# Altium footprint library HubProModel_v1.PcbLib: 67 footprints (part 3 of 5)
Each footprint in its own frame and in the unit in brackets; x right, y up, seen from the top. Pads: shape width x height; smd on the part's side, far side on the other; paste and mask are expansions set on the pad; w line width, h text height; cw(c..) or ccw(c..) is an arc to the next point about the centre after c.
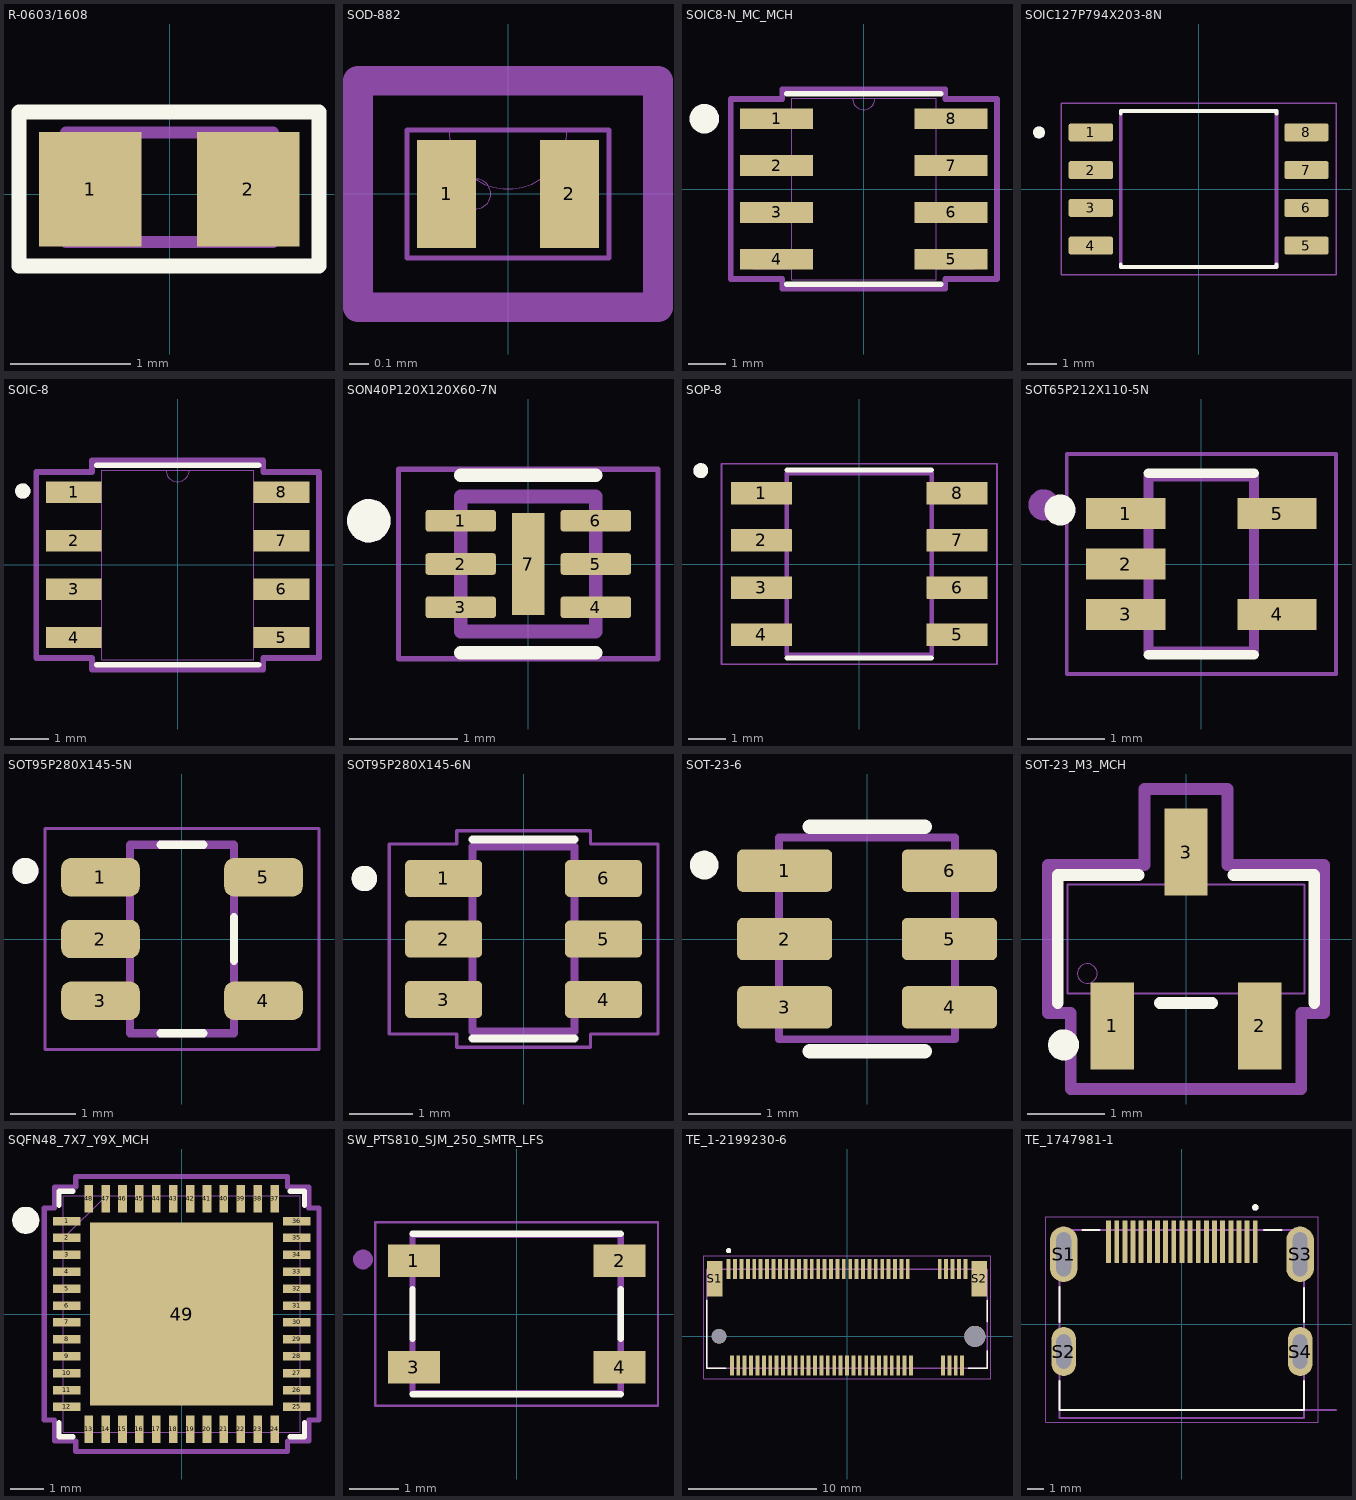
[diagram p2: the footprints below, top view; thin cyan lines are the x and y axes]

## R-0603/1608 [mm] "Chip Resistor, 2-Leads, Body 1.60x0.80mm, IPC Medium Density"
height 0.45
pads (2):
  rect 0.85x0.95 smd: 1(-0.659,0.042) 2(0.651,0.042)
Top Overlay:
  lines w0.127: -1.249,-0.594 -1.249,0.682 1.239,0.682 1.239,-0.594 -1.249,-0.594
Top Assembly:
  lines w0.1: -0.86,-0.394 0.858,-0.394 0.858,0.512 -0.801,0.512 -0.86,0.512 -0.86,-0.394
  text "'.Designator'" at -3.112,-1.801 h1.27
3D body "0603 resistor.STEP": height 0.45, standoff 0, extent -0.799,-0.348 0.801,0.452

## SOD-882 [mil] "Single-line low capacitance Transil™, transient surge voltage suppressor (TVS) for ESD protection"
pads (2):
  rect 12x22 smd paste+0 mask+0: 1(-12.5,0) 2(12.5,0)
Mechanical 13:
  circle w0: c-6.5,0 r3
  lines w0: -12,13 ccw(c0,13) 12,13
  lines w1: -20.5,-13 -20.5,13 20.5,13 20.5,-13 -20.5,-13
Mechanical 15:
  lines w6: -30.5,-23 30.5,-23 30.5,-21 30.5,21 30.5,23 -30.5,23 -30.5,21 -30.5,-21 -30.5,-23
3D body "SOD882_STM.step": height 20.12, standoff 0, extent -20.51,-12.99 20.51,12.99

## SOIC8-N_MC_MCH [mil] "Microwire Serial EEPROM Family, 1.8 to 5.5V, 3 MHz, -40°Cto 125°C, SOIC-8, RoHS"
pads (8):
  rect 78x22 smd paste+0 mask+0: 1(-93,75) 2(-93,25) 3(-93,-25) 4(-93,-75) 5(93,-75) 6(93,-25) 7(93,25) 8(93,75)
Top Overlay:
  lines w6: -82,-101.5 82,-101.5 ; -82,101.5 82,101.5
  lines w15.75: -170.05,82.87 ccw(c-170,75) -169.95,82.87
Mechanical 13:
  lines w0: -12,96.5 ccw(c0,96.5) 12,96.5
  lines w1: -118,-85 -77,-85 -77,-65 -118,-65 -118,-85 ; -118,-35 -77,-35 -77,-15 -118,-15 -118,-35 ; -118,15 -77,15 -77,35 -118,35 -118,15 ; -118,65 -77,65 -77,85 -118,85 -118,65 ; -77,-96.5 -77,96.5 77,96.5 77,-96.5 -77,-96.5 ; 77,-85 118,-85 118,-65 77,-65 77,-85 ; 77,-35 118,-35 118,-15 77,-15 77,-35 ; 77,15 118,15 118,35 77,35 77,15 ; 77,65 118,65 118,85 77,85 77,65
Mechanical 15:
  lines w6: -142,-96 -87,-96 -87,-106.5 87,-106.5 87,-96 142,-96 142,96 87,96 87,106.5 -87,106.5 -87,96 -142,96 -142,-96
3D body "SOIC8-N_MC_MCH.step": height 69.09, standoff 0, extent -117.99,-96.5 117.99,96.5

## SOIC127P794X203-8N [mm] "IC FLASH 16MBIT SPI/QUAD 8SOIJ"
height 0.89
pads (8):
  rrect25% 1.49x0.61 smd: 1(-3.63,1.905) 2(-3.63,0.635) 3(-3.63,-0.635) 4(-3.63,-1.905) 5(3.63,-1.905) 6(3.63,-0.635) 7(3.63,0.635) 8(3.63,1.905)
Top Overlay:
  circle w0.2: c-5.375,1.905 r0.1
  lines w0.127: -2.625,-2.53 -2.625,-2.63 2.625,-2.63 2.625,-2.53 ; -2.625,2.53 -2.625,2.63 2.625,2.63 2.625,2.53
Mechanical 13:
  circle w0.2: c-5.375,1.905 r0.1
  lines w0.127: -2.625,-2.63 2.625,-2.63 2.625,2.63 -2.625,2.63 -2.625,-2.63
Mechanical 15:
  lines w0.05: -4.625,-2.88 -4.625,2.88 4.625,2.88 4.625,-2.88 -4.625,-2.88
3D body "step_temp.STEP": height 2.03, standoff 0, extent -3.97,-2.63 3.97,2.63

## SOIC-8 [mil] "FLASH - NOR Memory IC 8Mb (1M x 8) SPI - Quad I/O 104 MHz 8-SOIC"
pads (8):
  rect 57.5x22 smd paste+0 mask+0: 1(-107.25,75) 2(-107.25,25) 3(-107.25,-25) 4(-107.25,-75) 5(107.25,-75) 6(107.25,-25) 7(107.25,25) 8(107.25,75)
Top Overlay:
  circle w7.87: c-159.88,76.34 r3.94
  lines w6: -83.5,-103 83.5,-103 ; -83.5,103 83.5,103
Mechanical 13:
  circle w7.87: c-159.88,76.34 r3.94
  lines w0: -12,98 ccw(c0,98) 12,98
  lines w1: -122,-85 -78.5,-85 -78.5,-65 -122,-65 -122,-85 ; -122,-35 -78.5,-35 -78.5,-15 -122,-15 -122,-35 ; -122,15 -78.5,15 -78.5,35 -122,35 -122,15 ; -122,65 -78.5,65 -78.5,85 -122,85 -122,65 ; -78.5,-98 -78.5,98 78.5,98 78.5,-98 -78.5,-98 ; 78.5,-85 122,-85 122,-65 78.5,-65 78.5,-85 ; 78.5,-35 122,-35 122,-15 78.5,-15 78.5,-35 ; 78.5,15 122,15 122,35 78.5,35 78.5,15 ; 78.5,65 122,65 122,85 78.5,85 78.5,65
Mechanical 15:
  lines w6: -146,-96 -88.5,-96 -88.5,-108 88.5,-108 88.5,-96 146,-96 146,96 88.5,96 88.5,108 -88.5,108 -88.5,96 -146,96 -146,-96
3D body "WIN_SN-8_WIN.step": height 69.09, standoff 0, extent -122.01,-97.99 122.01,97.99

## SON40P120X120X60-7N [mm] "IC REG LINEAR 3.3V 500MA 6TDFN"
pads (7):
  rrect25% 0.65x0.2 smd: 1(-0.625,0.4) 2(-0.625,0) 3(-0.625,-0.4) 4(0.625,-0.4) 5(0.625,0) 6(0.625,0.4)
  rect 0.3x0.94 smd paste-1: 7(0,0)
Top Overlay:
  circle w0.2: c-1.475,0.4 r0.1
  lines w0.127: -0.625,-0.82 0.625,-0.82 ; -0.625,0.82 0.625,0.82
Top Paste:
  region: 0.072,-0.392 -0.072,-0.392 -0.072,0.392 0.072,0.392
Mechanical 13:
  circle w0.2: c-1.475,0.4 r0.1
  lines w0.127: -0.625,-0.625 -0.625,0.625 0.625,0.625 0.625,-0.625 -0.625,-0.625
Mechanical 15:
  lines w0.05: -1.2,-0.875 -1.2,0.875 1.2,0.875 1.2,-0.875 -1.2,-0.875

## SOP-8 [mm] "FLASH - NOR Memory IC 8Mb (1M x 8) SPI 86 MHz 8-SOP"
height 1.75
pads (8):
  rrect8% 1.65x0.61 smd: 1(-2.635,1.905) 2(-2.635,0.635) 3(-2.635,-0.635) 4(-2.635,-1.905) 5(2.635,-1.905) 6(2.635,-0.635) 7(2.635,0.635) 8(2.635,1.905)
Top Overlay:
  circle w0.2: c-4.27,2.515 r0.1
  lines w0.127: -1.95,-2.53 1.95,-2.53 ; -1.95,2.53 1.95,2.53
Mechanical 13:
  circle w0.2: c-4.27,2.515 r0.1
  lines w0.127: -1.95,-2.45 -1.95,2.45 1.95,2.45 1.95,-2.45 -1.95,-2.45
Mechanical 15:
  lines w0.05: -3.71,-2.7 -3.71,2.7 3.71,2.7 3.71,-2.7 -3.71,-2.7
3D body "step_temp.STEP": height 1.75, standoff 0, extent -3,-2.45 3,2.45

## SOT65P212X110-5N [mm] "Inverter Schmitt Trigger 1-Element CMOS 5-Pin TSSOP T/R"
pads (5):
  rect 1.02x0.4 smd: 1(-0.975,0.65) 2(-0.975,0) 3(-0.975,-0.65) 4(0.975,-0.65) 5(0.975,0.65)
Top Overlay:
  circle w0.2: c-1.822,0.696 r0.1
  lines w0.127: -0.68,-1.17 0.68,-1.17 ; -0.68,1.17 0.68,1.17
Mechanical 13:
  circle w0.2: c-2.032,0.762 r0.1
  lines w0.127: -0.68,-1.13 -0.68,1.13 0.68,1.13 0.68,-1.13 -0.68,-1.13
Mechanical 15:
  lines w0.05: -1.735,-1.42 1.735,-1.42 1.735,1.42 -1.735,1.42 -1.735,-1.42
3D body "step_temp.STEP": height 1.1, standoff 0, extent -1.062,-1 1.062,1

## SOT95P280X145-5N [mm] "1.5A Buck Converter in SOT23 Package"
pads (5):
  rrect50% 1.21x0.59 smd: 1(-1.255,0.95) 2(-1.255,0) 3(-1.255,-0.95) 4(1.255,-0.95) 5(1.255,0.95)
Top Overlay:
  circle w0.2: c-2.41,1.05 r0.1
  lines w0.127: -0.33,-1.45 0.33,-1.45 ; -0.33,1.45 0.33,1.45 ; 0.8,-0.335 0.8,0.335
Mechanical 13:
  circle w0.2: c-2.41,1.05 r0.1
  lines w0.127: -0.8,-1.45 0.8,-1.45 0.8,1.45 -0.8,1.45 -0.8,-1.45
Mechanical 15:
  lines w0.05: -2.11,-1.7 -2.11,1.7 2.11,1.7 2.11,-1.7 -2.11,-1.7

## SOT95P280X145-6N [mm] "USB dedicated charging port controller - Gen 2"
pads (6):
  rrect25% 1.21x0.58 smd: 1(-1.255,0.95) 2(-1.255,0) 3(-1.255,-0.95) 4(1.255,-0.95) 5(1.255,0) 6(1.255,0.95)
Top Overlay:
  circle w0.2: c-2.5,0.95 r0.1
  lines w0.127: -0.8,-1.56 0.8,-1.56 ; -0.8,1.56 0.8,1.56
Mechanical 13:
  circle w0.2: c-2.5,0.95 r0.1
  lines w0.127: -0.8,-1.45 0.8,-1.45 0.8,1.45 -0.8,1.45 -0.8,-1.45
Mechanical 15:
  lines w0.05: -2.11,-1.49 -1.05,-1.49 -1.05,-1.7 1.05,-1.7 1.05,-1.49 2.11,-1.49 2.11,1.49 1.05,1.49 1.05,1.7 -1.05,1.7 -1.05,1.49 -2.11,1.49 -2.11,-1.49
3D body "step_temp.STEP": height 1.45, standoff 0, extent -1.4,-1.45 1.4,1.45

## SOT-23-6 [mm] "LOAD SWITCH,SOT26,T&R,3K"
pads (6):
  rrect25% 1.32x0.59 smd: 1(-1.145,0.95) 2(-1.145,0) 3(-1.145,-0.95) 4(1.145,-0.95) 5(1.145,0) 6(1.145,0.95)
Top Overlay:
  circle w0.2: c-2.264,1.027 r0.1
  lines w0.2: -0.8,-1.56 0.8,-1.56 ; -0.8,1.56 0.8,1.56
Top Assembly:
  circle w0.2: c-0.793,0.967 r0.1
  lines w0.11: -1.222,-1.393 1.221,-1.393 1.221,1.413 -1.207,1.413 -1.222,1.413 -1.222,-1.393
  text "'.Designator'" at -3.613,-2.754 h1.27
3D body "User Library-SOT23-6-1.STEP": height 1.09, standoff 0, extent -1.211,-1.389 1.215,1.405

## SOT-23_M3_MCH [mil] "Supervisor Open Drain or Open Collector 1 Channel SOT-23-3"
height 35.04
pads (3):
  rect 22x44 smd paste+0 mask+0: 1(-37.4,-44) 2(37.4,-44) 3(0,44)
Top Overlay:
  circle w7.87: c-62.02,-53.68 r3.94
  lines w6: -65,-32.5 -65,32.5 -24.1,32.5 ; -13.3,-32.5 13.3,-32.5 ; 24.1,32.5 65,32.5 65,-32.5
Mechanical 13:
  circle w0: c-50,-17.5 r5
  lines w1: -60,-27.5 60,-27.5 60,27.5 -60,27.5 -60,-27.5 ; -47.4,-52 -47.4,-27.5 -27.4,-27.5 -27.4,-52 -47.4,-52 ; -10,27.5 10,27.5 10,52 -10,52 -10,27.5 ; 27.4,-52 27.4,-27.5 47.4,-27.5 47.4,-52 27.4,-52
Mechanical 15:
  lines w6: -70,-37.5 -70,37.5 -21,37.5 -21,76 21,76 21,37.5 70,37.5 70,-37.5 58.4,-37.5 58.4,-76 -58.4,-76 -58.4,-37.5 -70,-37.5
3D body "SOT-23_M3_MCH.step": height 44.09, standoff 0, extent -60,-52.01 60,52.01

## SQFN48_7X7_Y9X_MCH [mil] "Ethernet Controller 10/100/1000 Base-TX PHY - Interface 48-SQFN (7x7)"
pads (49):
  rect 32x10 smd paste+0 mask+0: 1(-134,108.27) 2(-134,88.58) 3(-134,68.9) 4(-134,49.21) 5(-134,29.53) 6(-134,9.84) 7(-134,-9.84) 8(-134,-29.53) 9(-134,-49.21) 10(-134,-68.9) 11(-134,-88.58) 12(-134,-108.27) 25(134,-108.27) 26(134,-88.58) 27(134,-68.9) 28(134,-49.21) 29(134,-29.53) 30(134,-9.84) 31(134,9.84) 32(134,29.53) 33(134,49.21) 34(134,68.9) 35(134,88.58) 36(134,108.27)
  rect 10x32 smd paste+0 mask+0: 13(-108.27,-134) 14(-88.58,-134) 15(-68.9,-134) 16(-49.21,-134) 17(-29.53,-134) 18(-9.84,-134) 19(9.84,-134) 20(29.53,-134) 21(49.21,-134) 22(68.9,-134) 23(88.58,-134) 24(108.27,-134) 37(108.27,134) 38(88.58,134) 39(68.9,134) 40(49.21,134) 41(29.53,134) 42(9.84,134) 43(-9.84,134) 44(-29.53,134) 45(-49.21,134) 46(-68.9,134) 47(-88.58,134) 48(-108.27,134)
  rect 213x213 smd paste-106.5 mask+0: 49(0,0)
Top Overlay:
  lines w6: -143,-126.37 -143,-143 -126.37,-143 ; -143,126.37 -143,143 -126.37,143 ; 126.37,-143 143,-143 143,-126.37 ; 126.37,143 143,143 143,126.37
  lines w15.75: -181.61,117 ccw(c-181.56,109.13) -181.51,117
Top Paste:
  region: -57.19,102.56 -102.56,102.56 -102.56,57.19 -57.19,57.19
  region: -57.19,49.31 -102.56,49.31 -102.56,3.94 -57.19,3.94
  region: -57.19,-3.94 -102.56,-3.94 -102.56,-49.31 -57.19,-49.31
  region: -57.19,-57.19 -102.56,-57.19 -102.56,-102.56 -57.19,-102.56
  region: -3.94,102.56 -49.31,102.56 -49.31,57.19 -3.94,57.19
  region: -3.94,49.31 -49.31,49.31 -49.31,3.94 -3.94,3.94
  region: -3.94,-3.94 -49.31,-3.94 -49.31,-49.31 -3.94,-49.31
  region: -3.94,-57.19 -49.31,-57.19 -49.31,-102.56 -3.94,-102.56
  region: 49.31,102.56 3.94,102.56 3.94,57.19 49.31,57.19
  region: 49.31,49.31 3.94,49.31 3.94,3.94 49.31,3.94
  region: 49.31,-3.94 3.94,-3.94 3.94,-49.31 49.31,-49.31
  region: 49.31,-57.19 3.94,-57.19 3.94,-102.56 49.31,-102.56
  region: 102.56,102.56 57.19,102.56 57.19,57.19 102.56,57.19
  region: 102.56,49.31 57.19,49.31 57.19,3.94 102.56,3.94
  region: 102.56,-3.94 57.19,-3.94 57.19,-49.31 102.56,-49.31
  region: 102.56,-57.19 57.19,-57.19 57.19,-102.56 102.56,-102.56
Mechanical 13:
  lines w1: -138,88 -88,138 ; -138,-138 138,-138 138,138 -138,138 -138,-138 ; -138,-114.27 -138,-102.27 -138,-114.27 ; -138,-94.58 -138,-82.58 -138,-94.58 ; -138,-74.9 -138,-62.9 -138,-74.9 ; -138,-55.21 -138,-43.21 -138,-55.21 ; -138,-35.53 -138,-23.53 -138,-35.53 ; -138,-15.84 -138,-3.84 -138,-15.84 ; -138,3.84 -138,15.84 -138,3.84 ; -138,23.53 -138,35.53 -138,23.53 ; -138,43.21 -138,55.21 -138,43.21 ; -138,62.9 -138,74.9 -138,62.9 ; -138,82.58 -138,94.58 -138,82.58 ; -138,102.27 -138,114.27 -138,102.27 ; -114.27,-138 -102.27,-138 -114.27,-138 ; -114.27,138 -102.27,138 -114.27,138 ; -94.58,-138 -82.58,-138 -94.58,-138 ; -94.58,138 -82.58,138 -94.58,138 ; -74.9,-138 -62.9,-138 -74.9,-138 ; -74.9,138 -62.9,138 -74.9,138 ; -55.21,-138 -43.21,-138 -55.21,-138 ; -55.21,138 -43.21,138 -55.21,138 ; -35.53,-138 -23.53,-138 -35.53,-138 ; -35.53,138 -23.53,138 -35.53,138 ; -15.84,-138 -3.84,-138 -15.84,-138 ; -15.84,138 -3.84,138 -15.84,138 ; 3.84,-138 15.84,-138 3.84,-138 ; 3.84,138 15.84,138 3.84,138 ; 23.53,-138 35.53,-138 23.53,-138 ; 23.53,138 35.53,138 23.53,138 ; 43.21,-138 55.21,-138 43.21,-138 ; 43.21,138 55.21,138 43.21,138 ; 62.9,-138 74.9,-138 62.9,-138 ; 62.9,138 74.9,138 62.9,138 ; 82.58,-138 94.58,-138 82.58,-138 ; 82.58,138 94.58,138 82.58,138 ; 102.27,-138 114.27,-138 102.27,-138 ; 102.27,138 114.27,138 102.27,138 ; 138,-114.27 138,-102.27 138,-114.27 ; 138,-94.58 138,-82.58 138,-94.58 ; 138,-74.9 138,-62.9 138,-74.9 ; 138,-55.21 138,-43.21 138,-55.21 ; 138,-35.53 138,-23.53 138,-35.53 ; 138,-15.84 138,-3.84 138,-15.84 ; 138,3.84 138,15.84 138,3.84 ; 138,23.53 138,35.53 138,23.53 ; 138,43.21 138,55.21 138,43.21 ; 138,62.9 138,74.9 138,62.9 ; 138,82.58 138,94.58 138,82.58 ; 138,102.27 138,114.27 138,102.27
Mechanical 15:
  lines w6: -160,-123.27 -148,-123.27 -148,-148 -123.27,-148 -123.27,-160 123.27,-160 123.27,-148 148,-148 148,-123.27 160,-123.27 160,123.27 148,123.27 148,148 123.27,148 123.27,160 -123.27,160 -123.27,148 -148,148 -148,123.27 -160,123.27 -160,-123.27
3D body "SQFN48_7X7_Y9X_MCH.step": height 39.09, standoff 0, extent -137.99,-137.99 137.99,137.99

## SW_PTS810_SJM_250_SMTR_LFS [mm] "Tactile Switch SPST-NO Top Actuated Surface Mount"
height 0.89
pads (4):
  rect 1.05x0.65 smd: 1(-2.075,1.075) 2(2.075,1.075) 3(-2.075,-1.075) 4(2.075,-1.075)
Top Overlay:
  lines w0.127: -2.1,-1.62 2.1,-1.62 ; -2.1,-0.5 -2.1,0.5 ; -2.1,1.62 2.1,1.62 ; 2.1,-0.5 2.1,0.5
Mechanical 13:
  circle w0.2: c-3.1,1.1 r0.1
  lines w0.127: -2.1,-1.6 -2.1,1.6 2.1,1.6 2.1,-1.6 -2.1,-1.6
Mechanical 15:
  lines w0.05: -2.85,-1.85 -2.85,1.85 2.85,1.85 2.85,-1.85 -2.85,-1.85

## TE_1-2199230-6 [mm] "M.2 0.5PITCH 4.2H KEY M 30U AU"
pads (71):
  rect 0.3x1.55 smd: 1(-9.25,5.275) 2(-9,-2.275) 3(-8.75,5.275) 4(-8.5,-2.275) 5(-8.25,5.275) 6(-8,-2.275) 7(-7.75,5.275) 8(-7.5,-2.275) 9(-7.25,5.275) 10(-7,-2.275) 11(-6.75,5.275) 12(-6.5,-2.275) 13(-6.25,5.275) 14(-6,-2.275) 15(-5.75,5.275) 16(-5.5,-2.275) 17(-5.25,5.275) 18(-5,-2.275) 19(-4.75,5.275) 20(-4.5,-2.275) 21(-4.25,5.275) 22(-4,-2.275) 23(-3.75,5.275) 24(-3.5,-2.275) 25(-3.25,5.275) 26(-3,-2.275) 27(-2.75,5.275) 28(-2.5,-2.275) 29(-2.25,5.275) 30(-2,-2.275) 31(-1.75,5.275) 32(-1.5,-2.275) 33(-1.25,5.275) 34(-1,-2.275) 35(-0.75,5.275) 36(-0.5,-2.275) 37(-0.25,5.275) 38(0,-2.275) 39(0.25,5.275) 40(0.5,-2.275) 41(0.75,5.275) 42(1,-2.275) 43(1.25,5.275) 44(1.5,-2.275) 45(1.75,5.275) 46(2,-2.275) 47(2.25,5.275) 48(2.5,-2.275) 49(2.75,5.275) 50(3,-2.275) 51(3.25,5.275) 52(3.5,-2.275) 53(3.75,5.275) 54(4,-2.275) 55(4.25,5.275) 56(4.5,-2.275) 57(4.75,5.275) 58(5,-2.275) 67(7.25,5.275) 68(7.5,-2.275) 69(7.75,5.275) 70(8,-2.275) 71(8.25,5.275) 72(8.5,-2.275) 73(8.75,5.275) 74(9,-2.275) 75(9.25,5.275)
  rect 1.2x2.75 smd: S1(-10.35,4.5) S2(10.35,4.5)
  round 1.15 hole 1.15 unplated: ""(-10,0)
  round 1.65 hole 1.65 unplated: ""(10,0)
Top Overlay:
  circle w0.2: c-9.25,6.7 r0.1
  lines w0.127: -10.95,2.805 -10.95,-2.5 -9.47,-2.5 ; 9.47,-2.5 10.95,-2.5 10.95,-1.145 ; 10.95,1.145 10.95,2.805
Mechanical 13:
  circle w0.2: c-9.25,6.7 r0.1
  lines w0.127: -10.95,-2.5 10.95,-2.5 10.95,5.25 -10.95,5.25 -10.95,-2.5
Mechanical 15:
  lines w0.05: -11.2,-3.3 -11.2,6.3 11.25,6.3 11.25,-3.3 -11.2,-3.3
3D body "step_temp.STEP": height 4.2, standoff -0.65, extent -11.049,-3.334 10.851,5.366

## TE_1747981-1 [mm] "HDMI Type A Standard Top Mount Receptable"
height 6.58
pads (23):
  rect 0.3x2.6 smd mask+0.05: 1(4.5,5.035) 2(4,5.035) 3(3.5,5.035) 4(3,5.035) 5(2.5,5.035) 6(2,5.035) 7(1.5,5.035) 8(1,5.035) 9(0.5,5.035) 10(0,5.035) 11(-0.5,5.035) 12(-1,5.035) 13(-1.5,5.035) 14(-2,5.035) 15(-2.5,5.035) 16(-3,5.035) 17(-3.5,5.035) 18(-4,5.035) 19(-4.5,5.035)
  oval 1.7x3.4 hole 0.9 slot 2.7 at 90 deg: S1(-7.25,4.275) S3(7.25,4.275)
  oval 1.5x3 hole 0.9 slot 2.1 at 90 deg: S2(-7.25,-1.685) S4(7.25,-1.685)
Top Overlay:
  circle w0.2: c4.5,7.155 r0.1
  lines w0.127: -7.5,-3.495 -7.5,-5.275 7.5,-5.275 7.5,-3.495 ; -7.5,0.125 -7.5,2.265 ; -6.11,5.775 -5.05,5.775 ; 5.05,5.775 6.11,5.775 ; 7.5,0.125 7.5,2.215
Mechanical 13:
  circle w0.2: c4.5,7.155 r0.1
  lines w0.127: 9.45,-5.27 7.5,-5.27 ; -7.5,-5.275 -7.5,5.775 7.5,5.775 7.5,-5.27 ; -7.5,-5.275 -7.5,-5.775 7.5,-5.775 7.5,-5.275 ; -7.5,-5.275 7.5,-5.275 ; 7.5,-5.275 7.5,-5.27
  text "PCB EDGE" at 8.59,-4.89 h0.81
Mechanical 15:
  lines w0.05: -8.35,-6.025 -8.35,6.585 8.35,6.585 8.35,-6.025 -8.35,-6.025